# Altium footprint library Hydrolib_pcb.PcbLib: 101 footprints (part 6 of 7)
Each footprint in its own frame and in the unit in brackets; x right, y up, seen from the top. Pads: shape width x height; smd on the part's side, far side on the other; paste and mask are expansions set on the pad; w line width, h text height; cw(c..) or ccw(c..) is an arc to the next point about the centre after c.
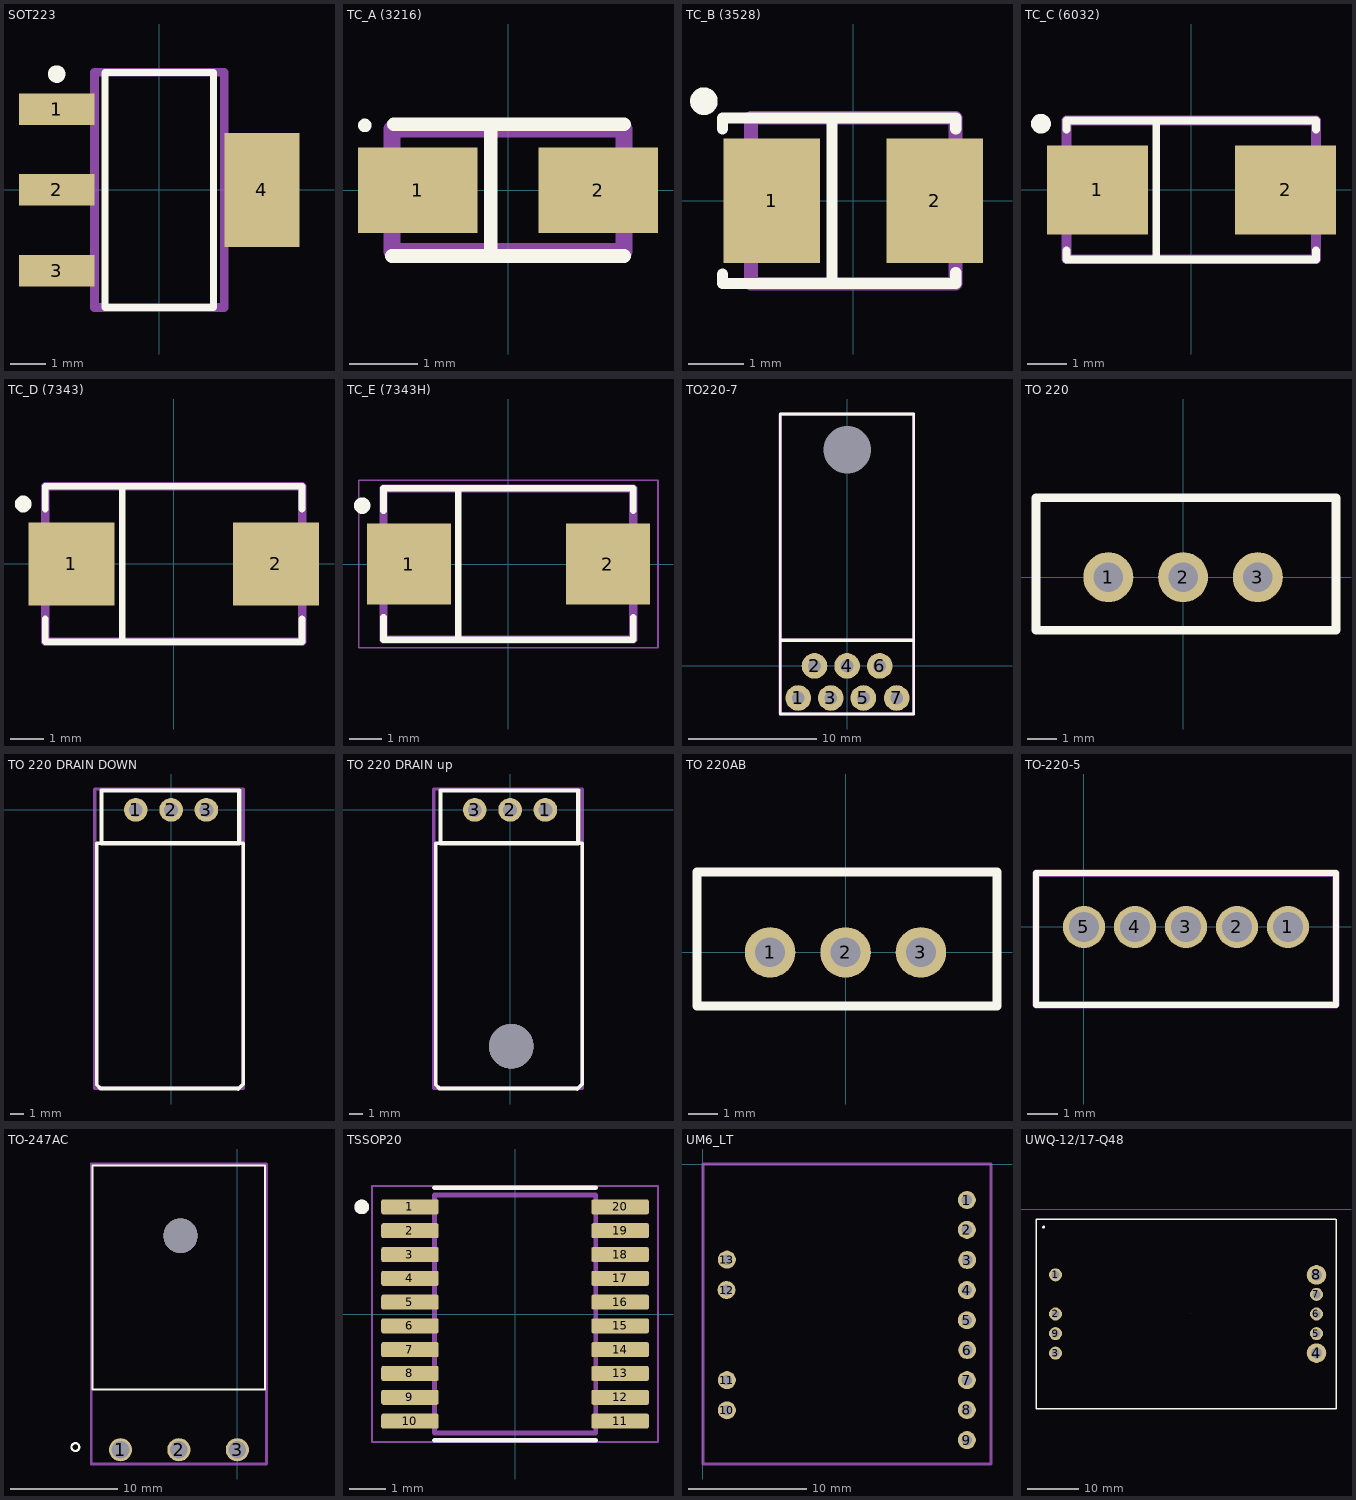
[diagram p5: the footprints below, top view; thin cyan lines are the x and y axes]

## SOT223 [mm] "SOT223, ld1117"
height 1.8
pads (4):
  rect 2.15x0.9 smd: 1(-2.925,2.3) 2(-2.925,0) 3(-2.925,-2.3)
  rect 2.15x3.25 smd: 4(2.925,0)
Top Overlay:
  circle w0.25: c-2.925,3.3 r0.125
  lines w0.2: -1.55,-3.35 1.55,-3.35 1.55,3.35 -1.55,3.35 -1.55,-3.35
Pattern top:
  lines w0.25: -1.85,-3.35 1.85,-3.35 1.85,3.35 -1.85,3.35 -1.85,-3.35
  text ".Designator" at 0.7,-2.9 h2.15
3D body "SOT223-3.step": height 1.6, standoff 0, extent -3.562,-3.3 3.512,3.2

## TC_A (3216) [mm] "Tantalum capacitor, type A,  1 pin - plus"
height 1.8
pads (2):
  rect 1.75x1.25 smd: 1(-1.325,0) 2(1.325,0)
Top Overlay:
  circle w0.1: c-2.1,0.95 r0.05
  lines w0.2: -1.702,-0.965 -0.254,-0.965 ; -1.676,0.965 -0.254,0.965 ; 1.702,-0.965 -0.254,-0.965 ; 1.702,0.965 -0.254,0.965 ; -0.254,-0.965 -0.254,0.965
Pattern top:
  lines w0.25: -1.7,-0.9 1.7,-0.9 1.7,0.9 -1.7,0.9 -1.7,-0.9
  text ".Designator" at 3.7,5.303 h2.15
3D body "Tant Cap SMD size A _ 3216-18.stp": height 1.64, standoff 0.01, extent -1.73,-0.8 1.73,0.8

## TC_B (3528) [mm] "Tantalum capacitor, type B, 1 pin - plus"
height 2.1
pads (2):
  rect 1.75x2.25 smd: 1(-1.475,0) 2(1.475,0)
Top Overlay:
  circle w0.25: c-2.7,1.8 r0.125
  lines w0.2: -2.362,-1.321 -2.362,-1.499 -2.361,-1.5 -0.381,-1.5 1.854,-1.5 1.854,-1.295 ; -2.361,1.295 -2.361,1.5 -0.381,1.5 ; -0.381,-1.499 -0.381,1.5 ; 1.854,1.295 1.854,1.5 -0.381,1.5
Pattern top:
  lines w0.25: -1.85,-1.5 1.85,-1.5 1.85,1.5 -1.85,1.5 -1.85,-1.5
  text ".Designator" at 3.4,6.203 h2.15
3D body "CAPM-TANTB-BK.stp": height 2.1, standoff 0, extent -1.85,-1.5 1.85,1.5

## TC_C (6032) [mm] "Tantalum capacitor, type C, 1 pin - plus"
height 2.8
pads (2):
  rect 2.55x2.25 smd: 1(-2.375,0) 2(2.375,0)
Top Overlay:
  circle w0.25: c-3.8,1.675 r0.125
  lines w0.2: -3.15,-1.525 -3.15,-1.75 3.15,-1.75 3.15,-1.525 ; -3.15,1.525 -3.15,1.75 3.15,1.75 3.15,1.525 ; -0.889,-1.75 -0.889,1.75
Pattern top:
  lines w0.25: -3.15,-1.75 3.15,-1.75 3.15,1.75 -3.15,1.75 -3.15,-1.75
  text ".Designator" at 0.9,6.303 h2.15
3D body "CAPM-TANTC-YL.stp": height 2.8, standoff 0, extent -3.1,-1.7 3.1,1.7

## TC_D (7343) [mm] "Tantalum capacitor, type D, 1 pin - plus"
height 3.1
pads (2):
  rect 2.55x2.45 smd: 1(-3.025,0) 2(3.025,0)
Top Overlay:
  circle w0.25: c-4.45,1.775 r0.125
  lines w0.2: -3.8,-1.625 -3.8,-2.3 3.8,-2.3 3.8,-1.625 ; -3.8,1.625 -3.8,2.3 3.8,2.3 3.8,1.625 ; -1.524,-2.3 -1.524,2.3
Pattern top:
  lines w0.25: -3.8,-2.3 3.8,-2.3 3.8,2.3 -3.8,2.3 -3.8,-2.3
  text ".Designator" at 1.3,6.903 h2.15
3D body "CAPM-TANTD-YL.stp": height 3.1, standoff 0, extent -3.75,-2.25 3.75,2.25

## TC_E (7343H) [mm] "Tantalum capacitor, type E, 1 pin - plus"
height 4.3
pads (2):
  rect 2.55x2.45 smd: 1(-3.025,0) 2(3.025,0)
Top Overlay:
  circle w0.25: c-4.45,1.775 r0.125
  lines w0.2: -3.8,-1.625 -3.8,-2.3 3.8,-2.3 3.8,-1.625 ; -3.8,1.625 -3.8,2.3 3.8,2.3 3.8,1.625 ; -1.524,-2.3 -1.524,2.3
Pattern top:
  lines w0.25: -3.8,-2.3 3.8,-2.3 3.8,2.3 -3.8,2.3 -3.8,-2.3
  text ".Designator" at -1.6,-0.3 h2.15
Mechanical 15:
  lines w0.05: -4.55,-2.55 4.55,-2.55 4.55,2.55 -4.55,2.55 -4.55,-2.55
3D body "CAPM-TANTN-BK.stp": height 3, standoff 0, extent -3.75,-2.25 3.75,2.25

## TO220-7 [mm]
height 20
pads (8):
  round 0 hole 3.7: 0(-0.03,16.85)
  round 2 hole 1: 1(-3.84,-2.5) 2(-2.57,0) 3(-1.3,-2.5) 4(-0.03,0) 5(1.24,-2.5) 6(2.51,0) 7(3.84,-2.5)
Top Overlay:
  lines w0.2: -5.237,-3.75 -5.237,19.65 5.175,19.65 5.175,-3.75 -5.237,-3.75
  lines w0.25: -5.2,2 5.1,2
Template:
  lines w0: -5.237,-3.429 -5.237,6.223
Pattern top:
  lines w0.25: -5.25,-3.725 -5.25,19.6 ; -5.25,2 5.125,2 ; -5.225,19.625 5.15,19.625 5.15,-3.725 ; -5.175,-3.75 5.15,-3.75
  text ".Designator" at -5.2,20.625 h2.54
Mechanical 15:
  lines w0.05: 5.177,-3.429 5.177,6.223
3D body: height 4.4, standoff 0, extent -5.236,-3.749 5.174,19.649

## TO 220 [mm]
pads (3):
  round 1.7 hole 1: 1(-2.54,0) 2(0,0) 3(2.54,0)
Top Overlay:
  lines w0.3: -5,-1.8 -5,2.7 5.2,2.7 5.2,-1.8 -5,-1.8
Pattern top:
  lines w0.25: -5,-1.8 -5,2.7 5.2,2.7 5.2,-1.8 -5,-1.8
  text ".Designator" at -4.3,-0.8 h2.15
3D body "TO220.STEP": height 20.96, standoff -8.18, extent -5.15,-1.8 5.15,2.7

## TO 220 DRAIN DOWN [mm]
pads (3):
  round 1.7 hole 1: 1(-2.54,0) 2(0,0) 3(2.54,0)
Top Overlay:
  lines w0.254: -5.076,-20.028 -5.334,-19.77 -5.334,-2.413 5.182,-2.413 5.182,-19.708 4.824,-20.066 ; -4.873,1.397 4.9,1.397
  lines w0.3: -5.076,-20.028 4.824,-20.028 ; -5,-2.4 4.9,-2.4 4.9,1.397 -5,1.397 -5,-2.4
Pattern top:
  lines w0.25: -5.5,-20 5.2,-20 5.2,1.5 -5.5,1.5 -5.5,-20
  text ".Designator" at 0.3,-15 h2.15
3D body "MOSFET_FLIP.STEP": height 6.88, standoff -4.59, extent -5.27,-19.745 5.27,0.555

## TO 220 DRAIN up [mm]
pads (3):
  round 1.7 hole 1: 1(2.54,0) 2(0,0) 3(-2.54,0)
via 0.1,-17 diameter 3.2 hole 3.2
Top Overlay:
  lines w0.254: -5.076,-20.028 -5.334,-19.77 -5.334,-2.413 5.182,-2.413 5.182,-19.708 4.824,-20.066 ; -4.873,1.397 4.9,1.397
  lines w0.3: -5.076,-20.028 4.824,-20.028 ; -5,-2.4 4.9,-2.4 4.9,1.397 -5,1.397 -5,-2.4
Pattern top:
  lines w0.25: -5.5,-20 5.2,-20 5.2,1.5 -5.5,1.5 -5.5,-20
  text ".Designator" at 0.3,-15 h2.15
3D body "TO-220_correct_angle.STEP": height 4.51, standoff -2.26, extent -5.02,-20.025 5,0.225

## TO 220AB [mm]
pads (3):
  round 1.7 hole 1: 1(-2.54,0) 2(0,0) 3(2.54,0)
Top Overlay:
  lines w0.3: -5,-1.8 5.1,-1.8 5.1,2.7 -5,2.7 -5,-1.8
Pattern top:
  lines w0.25: -5,-1.8 5.1,-1.8 5.1,2.7 -5,2.7 -5,-1.8
  text ".Designator" at -4.3,-0.8 h2.15
3D body "TO220 - TO220AB.STEP": height 19.96, standoff -9.18, extent -5.15,-1.81 5.15,2.7

## TO-220-5 [mm]
pads (5):
  round 1.4 hole 1: 1(6.8,0) 2(5.1,0) 3(3.4,0) 4(1.7,0) 5(0,0)
Top Overlay:
  lines w0.2: -1.6,-2.6 8.4,-2.6 8.4,1.8 -1.6,1.8 -1.6,-2.6
Pattern top:
  lines w0.25: -1.6,-2.6 -1.6,1.8 8.4,1.8 8.4,-2.6 -1.6,-2.6
3D body "Деталь2.STEP": height 22.35, standoff -6.95, extent -1.6,-2.6 8.4,1.8

## TO-247AC [mil]
pads (3):
  round 85 hole 65 mask+0: 1(-429.92,-1268) 2(-214.96,-1268) 3(0,-1268)
via -208.66,-480.31 diameter 125.98 hole 125.98
Top Overlay:
  lines w7.87: -582.14,-1253.67 ccw(c-595.89,-1258.1) -581.61,-1255.91 ; -532.46,-1046.5 102.54,-1046.5 102.54,-221.5 -532.46,-221.5 -532.46,-1046.5
Pattern top:
  lines w9.84: -537.46,-1320.5 -537.46,-216.5 107.54,-216.5 107.54,-1320.5 -537.46,-1320.5
  text ".Designator" at -381.89,-196.85 h84.65
3D body "User Library-TO-247AC_bent_leads.STEP": height 232.28, standoff -271.65, extent -525.59,-1287.4 100.39,-267.72

## TSSOP20 [mm]
pads (20):
  rrect25% 1.57x0.41 smd: 1(-2.87,2.925) 2(-2.87,2.275) 3(-2.87,1.625) 4(-2.87,0.975) 5(-2.87,0.325) 6(-2.87,-0.325) 7(-2.87,-0.975) 8(-2.87,-1.625) 9(-2.87,-2.275) 10(-2.87,-2.925) 11(2.87,-2.925) 12(2.87,-2.275) 13(2.87,-1.625) 14(2.87,-0.975) 15(2.87,-0.325) 16(2.87,0.325) 17(2.87,0.975) 18(2.87,1.625) 19(2.87,2.275) 20(2.87,2.925)
Top Overlay:
  circle w0.2: c-4.19,2.925 r0.1
  lines w0.127: -2.2,-3.45 2.2,-3.45 ; -2.2,3.45 2.2,3.45
Pattern top:
  lines w0.127: -2.2,-3.25 2.2,-3.25 2.2,3.25 -2.2,3.25 -2.2,-3.25
Mechanical 13:
  circle w0.2: c-4.19,2.925 r0.1
Mechanical 15:
  lines w0.05: -3.905,-3.5 -3.905,3.5 3.905,3.5 3.905,-3.5 -3.905,-3.5
3D body "TCA9544APWR.STEP": height 1.2, standoff 0, extent -3.2,-3.25 3.2,3.25

## UM6_LT [mil]
pads (13):
  round 60 hole 35.43: 1(879.92,-120) 2(879.92,-219.49) 3(880.91,-320) 4(880,-420.28) 5(880,-520.67) 6(880.91,-620) 7(879.92,-720.47) 8(880,-819.88) 9(879.92,-920.28) 10(80,-820.87) 11(80,-720.47) 12(78.74,-420) 13(80,-318.9)
Template:
  lines w10: 960,-1000 0,-1000 0,0 960,0 960.63,-1000
Pattern top:
  text "String" at 192.91,59.06 h83.86
3D body "Сборка_2.STEP": height 472.44, standoff -15.75, extent -0.01,-1000 959.84,0

## UWQ-12/17-Q48 [mil]
height 500
pads (9):
  round 100 hole 62: 1(1527.64,-503.07) 2(1527.64,-803.07) 3(1527.64,-1103.07) 5(3527.64,-953.07) 6(3527.64,-803.07) 7(3527.64,-653.07) 9(1527.64,-953.07)
  round 150 hole 84: 4(3527.64,-1103.07) 8(3527.64,-503.07)
Top Overlay:
  circle w10: c1436.7,-137.72 r5.91
  lines w10: 1378.03,-1527.48 1378.03,-78.66 3677.24,-78.66 3677.25,-1527.48 ; 1378.03,-1527.48 3677.25,-1527.48 ; 1378.03,-1527.48 3677.25,-1527.48 ; 1378.03,-1527.48 1378.03,-1527.48 ; 3677.24,-1527.48 3677.25,-1527.48
Mechanical 15:
  lines w0.1: 2559.14,-799.07 2561.14,-797.07
3D body "mps_dcdc_uwq_12_17_q48_t_bp_a.step": height 496.82, standoff -188.18, extent 1378.03,-1528.07 3678.03,-78.07